# Altium footprint library Funk.PcbLib: 34 footprints (part 1 of 3)
Each footprint in its own frame and in the unit in brackets; x right, y up, seen from the top. Pads: shape width x height; smd on the part's side, far side on the other; paste and mask are expansions set on the pad; w line width, h text height; cw(c..) or ccw(c..) is an arc to the next point about the centre after c.
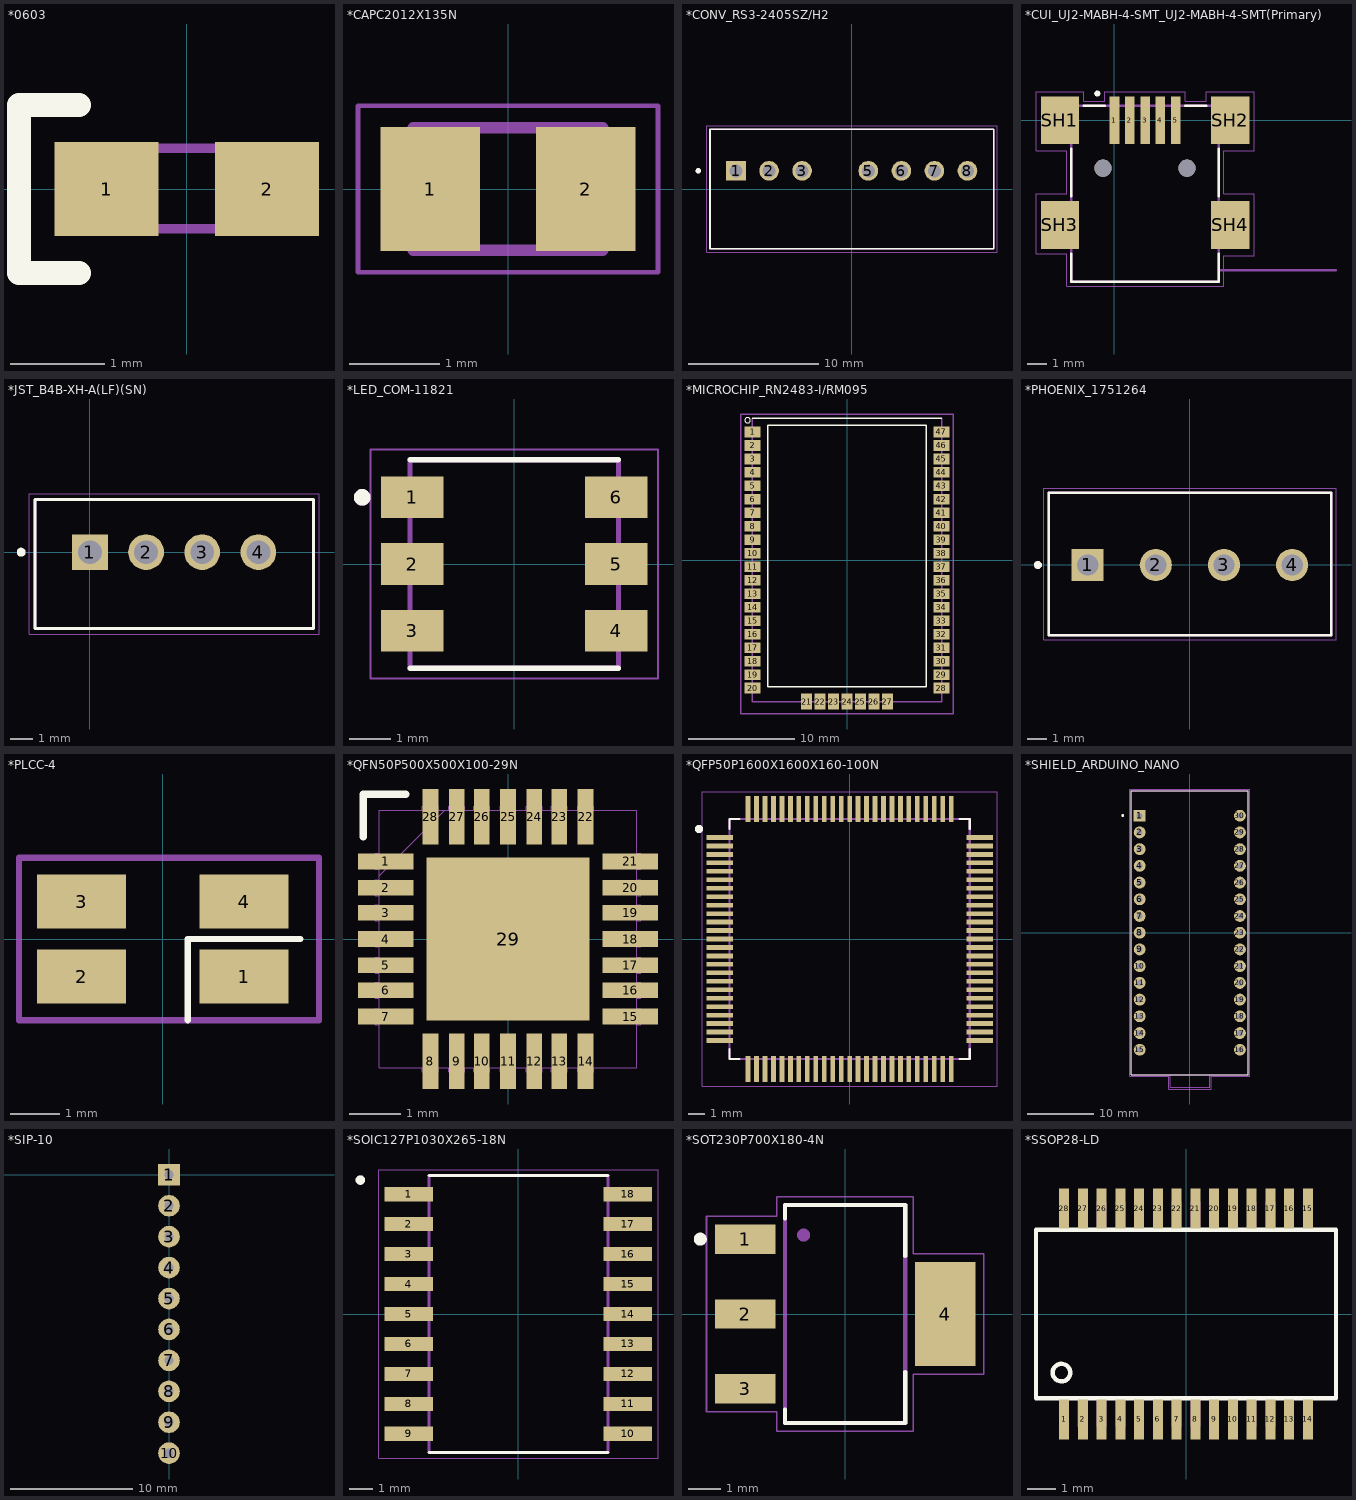
[diagram p0: the footprints below, top view; thin cyan lines are the x and y axes]

## *0603 [mm]
pads (2):
  rect 1.1x1 smd: 1(-0.85,0) 2(0.85,0)
Top Overlay:
  lines w0.254: -1.143,-0.889 -1.778,-0.889 -1.778,-0.762 -1.778,0.889 -1.143,0.889
Mechanical 4:
  region: 0.331,0.48 0.83,0.48 0.83,-0.471 0.331,-0.471
  region: -0.841,0.48 -0.338,0.48 -0.338,-0.472 -0.841,-0.472
  region: 0.331,0.48 0.83,0.48 0.83,-0.471 0.331,-0.471
  region: -0.841,0.48 -0.338,0.48 -0.338,-0.472 -0.841,-0.472
  lines w0.102: -0.356,-0.419 0.356,-0.419 -0.356,-0.419 ; -0.356,0.432 0.356,0.432 -0.356,0.432
3D body "LTST-C190KRKT.STEP": height 0.8, standoff 0, extent -0.8,-0.419 0.8,0.381

## *CAPC2012X135N [mm]
pads (2):
  rect 1.1x1.38 smd: 1(-0.863,0) 2(0.863,0)
Mechanical 4:
  lines w0.127: -1.05,-0.68 -1.05,0.68 ; -1.05,-0.68 1.05,-0.68 ; -1.05,-0.68 -1.05,0.68 ; -1.05,-0.68 1.05,-0.68 ; -1.05,0.68 1.05,0.68 ; -1.05,0.68 1.05,0.68 ; 1.05,-0.68 1.05,0.68 ; 1.05,-0.68 1.05,0.68
Mechanical 16:
  lines w0.05: -1.665,-0.925 -1.665,0.925 1.665,0.925 1.665,-0.925 -1.665,-0.925
3D body "C2012.step": height 1.25, standoff 0, extent -1,-0.625 1,0.625

## *CONV_RS3-2405SZ/H2 [mm]
pads (7):
  rect 1.508x1.508 hole 1: 1(-8.9,1.4)
  round 1.508 hole 1: 2(-6.36,1.4) 3(-3.82,1.4) 5(1.26,1.4) 6(3.8,1.4) 7(6.34,1.4) 8(8.88,1.4)
Top Overlay:
  circle w0.2: c-11.8,1.4 r0.1
  lines w0.127: -10.9,-4.6 10.9,-4.6 10.9,4.6 -10.9,4.6 -10.9,-4.6
Mechanical 4:
  circle w0.2: c-11.8,1.4 r0.1
  circle w0.2: c-11.8,1.4 r0.1
  lines w0.127: -10.9,-4.6 10.9,-4.6 ; -10.9,-4.6 -10.9,4.6 ; -10.9,-4.6 10.9,-4.6 ; -10.9,-4.6 -10.9,4.6 ; -10.9,4.6 10.9,4.6 ; -10.9,4.6 10.9,4.6 ; 10.9,-4.6 10.9,4.6 ; 10.9,-4.6 10.9,4.6
Mechanical 16:
  lines w0.05: -11.15,-4.85 -11.15,4.85 11.15,4.85 11.15,-4.85 -11.15,-4.85
3D body "RS3.step": height 11.1, standoff -4.1, extent -10.9,-4.473 10.9,4.727

## *CUI_UJ2-MABH-4-SMT_UJ2-MABH-4-SMT(Primary) [mm]
pads (11):
  rect 0.5x2.5 smd: 1(0,0) 2(0.8,0) 3(1.6,0) 4(2.4,0) 5(3.2,0)
  round 0.9 hole 0.9 unplated: None(-0.6,-2.51) None(3.8,-2.51)
  rect 2x2.5 smd: SH1(-2.86,0) SH2(6.06,0) SH3(-2.86,-5.48) SH4(6.06,-5.48)
Top Overlay:
  circle w0.16: c-0.9,1.4 r0.08
  lines w0.127: -2.26,-6.98 -2.26,-8.45 5.46,-8.45 5.46,-6.98 ; -2.26,-3.98 -2.26,-1.5 ; -1.61,0.75 -0.5,0.75 ; 3.7,0.75 4.81,0.75 ; 5.46,-3.98 5.46,-1.5
Mechanical 4:
  circle w0.16: c0,0.15 r0.08
  circle w0.16: c0,0.15 r0.08
  lines w0.127: -2.26,-8.45 5.46,-8.45 ; -2.26,-8.45 -2.26,0.75 ; -2.26,-8.45 5.46,-8.45 ; -2.26,-8.45 -2.26,0.75 ; -2.26,0.75 5.46,0.75 ; -2.26,0.75 5.46,0.75 ; 5.46,-8.45 5.46,-7.85 ; 5.46,-8.45 5.46,-7.85 ; 5.46,-7.85 5.46,0.75 ; 5.46,-7.85 11.6,-7.85 5.46,-7.85 ; 5.46,-7.85 5.46,0.75
  text "PCB EDGE" at 5.85,-9.1 h1.88
  text "PCB EDGE" at 5.85,-9.1 h1.88
Mechanical 16:
  lines w0.05: -4.11,-6.98 -4.11,-3.85 -2.51,-3.85 -2.51,-1.6 -4.11,-1.6 -4.11,1.5 -1.61,1.5 -1.61,1 -0.5,1 -0.5,1.5 3.7,1.5 3.7,1 4.81,1 4.81,1.5 7.31,1.5 7.31,-1.6 5.71,-1.6 5.71,-3.85 7.31,-3.85 7.31,-7.1 5.71,-7.1 5.71,-8.7 -2.51,-8.7 -2.51,-6.98 -4.11,-6.98
3D body "CUI_UJ2-MABH-4-SMT.step": height 3.93, standoff -0.95, extent -3.179,-8.418 6.481,0.962

## *JST_B4B-XH-A(LF)(SN) [mm]
pads (4):
  rect 1.59x1.59 hole 1.06: 1(0,0)
  round 1.59 hole 1.06: 2(2.5,0) 3(5,0) 4(7.5,0)
Top Overlay:
  circle w0.2: c-3.06,0 r0.1
  lines w0.127: -2.45,-3.4 -2.45,2.35 9.95,2.35 9.95,-3.4 -2.45,-3.4
Mechanical 4:
  lines w0.127: -2.45,-3.4 -2.45,2.35 ; -2.45,-3.4 9.95,-3.4 ; -2.45,-3.4 -2.45,2.35 ; -2.45,-3.4 9.95,-3.4 ; -2.45,2.35 9.95,2.35 ; -2.45,2.35 9.95,2.35 ; 9.95,-3.4 9.95,2.35 ; 9.95,-3.4 9.95,2.35
Mechanical 16:
  lines w0.05: -2.7,-3.65 -2.7,2.6 10.2,2.6 10.2,-3.65 -2.7,-3.65
3D body "B4B-XH-A.STEP": height 7.06, standoff -3.34, extent -2.517,-3.464 9.883,2.286

## *LED_COM-11821 [mm]
pads (6):
  rect 1.5x1 smd: 1(-2.45,1.6) 2(-2.45,0) 3(-2.45,-1.6) 4(2.45,-1.6) 5(2.45,0) 6(2.45,1.6)
Top Overlay:
  circle w0.2: c-3.65,1.6 r0.1
  lines w0.127: -2.5,-2.5 2.5,-2.5 ; -2.5,2.5 2.5,2.5
Mechanical 4:
  circle w0.2: c-3.65,1.6 r0.1
  circle w0.2: c-3.65,1.6 r0.1
  lines w0.127: -2.5,-2.5 2.5,-2.5 ; -2.5,-2.5 -2.5,2.5 ; -2.5,-2.5 2.5,-2.5 ; -2.5,-2.5 -2.5,2.5 ; -2.5,2.5 2.5,2.5 ; -2.5,2.5 2.5,2.5 ; 2.5,-2.5 2.5,2.5 ; 2.5,-2.5 2.5,2.5
Mechanical 16:
  lines w0.05: -3.45,-2.75 -3.45,2.75 3.45,2.75 3.45,-2.75 -3.45,-2.75
3D body "11821.step": height 1.75, standoff 0, extent -2.7,-2.486 2.7,2.514

## *MICROCHIP_RN2483-I/RM095 [mil]
pads (47):
  rect 60x40 smd: 1(-350,475) 2(-350,425) 3(-350,375) 4(-350,325) 5(-350,275) 6(-350,225) 7(-350,175) 8(-350,125) 9(-350,75) 10(-350,25) 11(-350,-25) 12(-350,-75) 13(-350,-125) 14(-350,-175) 15(-350,-225) 16(-350,-275) 17(-350,-325) 18(-350,-375) 19(-350,-425) 20(-350,-475) 28(350,-475) 29(350,-425) 30(350,-375) 31(350,-325) 32(350,-275) 33(350,-225) 34(350,-175) 35(350,-125) 36(350,-75) 37(350,-25) 38(350,25) 39(350,75) 40(350,125) 41(350,175) 42(350,225) 43(350,275) 44(350,325) 45(350,375) 46(350,425) 47(350,475)
  rect 40x60 smd: 21(-150,-525) 22(-100,-525) 23(-50,-525) 24(0,-525) 25(50,-525) 26(100,-525) 27(150,-525)
Top Overlay:
  circle w0: c-368.5,518.31 r10
  lines w5: -350.39,525.59 350.39,525.59 ; -294.49,-469.69 294.49,-469.69 294.49,499.61 -294.49,499.61 -294.49,-469.69
Mechanical 4:
  lines w5: -350.39,-525.59 350.39,-525.59 ; -350.39,-525.59 -350.39,525.59 -350.39,-525.59 ; -350.39,-525.59 350.39,-525.59 ; 350.39,-525.59 350.39,525.59 350.39,-525.59
Mechanical 16:
  lines w5: -393.7,-570.87 -393.7,541.34 393.7,541.34 393.7,-570.87 -393.7,-570.87
3D body "RN2483.step": height 118.11, standoff -1.02, extent -350.79,-529.99 349.99,520.01

## *PHOENIX_1751264 [mm]
pads (4):
  rect 1.65x1.65 hole 1.1: 1(-5.25,0)
  round 1.65 hole 1.1: 2(-1.75,0) 3(1.75,0) 4(5.25,0)
Top Overlay:
  circle w0.2: c-7.8,0 r0.1
  lines w0.127: -7.25,-3.6 -7.25,3.7 7.25,3.7 7.25,-3.6 -7.25,-3.6
Mechanical 4:
  circle w0.2: c-7.8,0 r0.1
  circle w0.2: c-7.8,0 r0.1
  lines w0.127: -7.25,-3.6 -7.25,3.7 ; -7.25,-3.6 7.25,-3.6 ; -7.25,-3.6 -7.25,3.7 ; -7.25,-3.6 7.25,-3.6 ; -7.25,3.7 7.25,3.7 ; -7.25,3.7 7.25,3.7 ; 7.25,-3.6 7.25,3.7 ; 7.25,-3.6 7.25,3.7
Mechanical 16:
  lines w0.05: -7.5,-3.85 -7.5,3.95 7.5,3.95 7.5,-3.85 -7.5,-3.85
3D body "pxc_1751264_04_MKDS-1-4-3-5_3D.stp": height 8.5, standoff -3.5, extent -7.239,-3.556 7.261,3.744

## *PLCC-4 [mm]
pads (4):
  rect 1.8x1.1 smd: 1(1.651,-0.762) 2(-1.651,-0.762) 3(-1.651,0.762) 4(1.651,0.762)
Top Overlay:
  lines w0.127: 0.508,-1.651 0.508,0 2.794,0
Mechanical 4:
  lines w0.127: 3.175,-1.143 3.175,-0.445 3.175,0.953 3.175,1.651 -2.921,1.651 -2.921,-1.651 3.175,-1.651 3.175,-0.635
3D body "User Library-Osram_Led_PLCC4.step": height 1.95, standoff 0, extent -1.75,-1.4 1.75,1.4

## *QFN50P500X500X100-29N [mil]
pads (29):
  rect 42x12 smd: 1(-93,59) 2(-93,39) 3(-93,20) 4(-93,0) 5(-93,-20) 6(-93,-39) 7(-93,-59) 15(93,-59) 16(93,-39) 17(93,-20) 18(93,0) 19(93,20) 20(93,39) 21(93,59)
  rect 12x42 smd: 8(-59,-93) 9(-39,-93) 10(-20,-93) 11(0,-93) 12(20,-93) 13(39,-93) 14(59,-93) 22(59,93) 23(39,93) 24(20,93) 25(0,93) 26(-20,93) 27(-39,93) 28(-59,93)
  rect 124x124 smd: 29(0,0)
Top Overlay:
  lines w6: -110,78 -110,110 -78,110
Mechanical 4:
  drawing of 234 lines, arcs and shapes, not listed
3D body "QFN28.step": height 35.43, standoff 0, extent -99.21,-99.21 99.22,99.21

## *QFP50P1600X1600X160-100N [mm]
pads (100):
  rect 1.56x0.28 smd: 1(-7.68,6) 2(-7.68,5.5) 3(-7.68,5) 4(-7.68,4.5) 5(-7.68,4) 6(-7.68,3.5) 7(-7.68,3) 8(-7.68,2.5) 9(-7.68,2) 10(-7.68,1.5) 11(-7.68,1) 12(-7.68,0.5) 13(-7.68,0) 14(-7.68,-0.5) 15(-7.68,-1) 16(-7.68,-1.5) 17(-7.68,-2) 18(-7.68,-2.5) 19(-7.68,-3) 20(-7.68,-3.5) 21(-7.68,-4) 22(-7.68,-4.5) 23(-7.68,-5) 24(-7.68,-5.5) 25(-7.68,-6) 51(7.68,-6) 52(7.68,-5.5) 53(7.68,-5) 54(7.68,-4.5) 55(7.68,-4) 56(7.68,-3.5) 57(7.68,-3) 58(7.68,-2.5) 59(7.68,-2) 60(7.68,-1.5) 61(7.68,-1) 62(7.68,-0.5) 63(7.68,0) 64(7.68,0.5) 65(7.68,1) 66(7.68,1.5) 67(7.68,2) 68(7.68,2.5) 69(7.68,3) 70(7.68,3.5) 71(7.68,4) 72(7.68,4.5) 73(7.68,5) 74(7.68,5.5) 75(7.68,6)
  rect 0.28x1.56 smd: 26(-6,-7.68) 27(-5.5,-7.68) 28(-5,-7.68) 29(-4.5,-7.68) 30(-4,-7.68) 31(-3.5,-7.68) 32(-3,-7.68) 33(-2.5,-7.68) 34(-2,-7.68) 35(-1.5,-7.68) 36(-1,-7.68) 37(-0.5,-7.68) 38(0,-7.68) 39(0.5,-7.68) 40(1,-7.68) 41(1.5,-7.68) 42(2,-7.68) 43(2.5,-7.68) 44(3,-7.68) 45(3.5,-7.68) 46(4,-7.68) 47(4.5,-7.68) 48(5,-7.68) 49(5.5,-7.68) 50(6,-7.68) 76(6,7.68) 77(5.5,7.68) 78(5,7.68) 79(4.5,7.68) 80(4,7.68) 81(3.5,7.68) 82(3,7.68) 83(2.5,7.68) 84(2,7.68) 85(1.5,7.68) 86(1,7.68) 87(0.5,7.68) 88(0,7.68) 89(-0.5,7.68) 90(-1,7.68) 91(-1.5,7.68) 92(-2,7.68) 93(-2.5,7.68) 94(-3,7.68) 95(-3.5,7.68) 96(-4,7.68) 97(-4.5,7.68) 98(-5,7.68) 99(-5.5,7.68) 100(-6,7.68)
Top Overlay:
  circle w0.24: c-8.9,6.5 r0.12
  lines w0.127: -7.1,-6.5 -7.1,-7.1 -6.5,-7.1 ; -7.1,6.5 -7.1,7.1 -6.5,7.1 ; 6.5,-7.1 7.1,-7.1 7.1,-6.5 ; 6.5,7.1 7.1,7.1 7.1,6.5
Mechanical 4:
  lines w0.127: -7.1,-7.1 7.1,-7.1 ; -7.1,-7.1 -7.1,7.1 ; -7.1,-7.1 7.1,-7.1 ; -7.1,-7.1 -7.1,7.1 ; -7.1,7.1 7.1,7.1 ; -7.1,7.1 7.1,7.1 ; 7.1,-7.1 7.1,7.1 ; 7.1,-7.1 7.1,7.1
Mechanical 16:
  lines w0.05: -8.71,-8.71 8.71,-8.71 8.71,8.71 -8.71,8.71 -8.71,-8.71
3D body "LQFP-100-11.STEP": height 1.5, standoff 0, extent -8,-8 8,8

## *SHIELD_ARDUINO_NANO [mm]
pads (30):
  rect 1.8x1.8 hole 0.9: 1(-7.62,17.78)
  round 1.8 hole 0.9: 2(-7.62,15.24) 3(-7.62,12.7) 4(-7.62,10.16) 5(-7.62,7.62) 6(-7.62,5.08) 7(-7.62,2.54) 8(-7.62,0) 9(-7.62,-2.54) 10(-7.62,-5.08) 11(-7.62,-7.62) 12(-7.62,-10.16) 13(-7.62,-12.7) 14(-7.62,-15.24) 15(-7.62,-17.78) 16(7.62,-17.78) 17(7.62,-15.24) 18(7.62,-12.7) 19(7.62,-10.16) 20(7.62,-7.62) 21(7.62,-5.08) 22(7.62,-2.54) 23(7.62,0) 24(7.62,2.54) 25(7.62,5.08) 26(7.62,7.62) 27(7.62,10.16) 28(7.62,12.7) 29(7.62,15.24) 30(7.62,17.78)
Top Overlay:
  circle w0.2: c-10.2,17.8 r0.1
  lines w0.127: -8.89,-21.59 8.89,-21.59 8.89,21.59 -8.89,21.59 -8.89,-21.59
Mechanical 4:
  circle w0.2: c-10.2,17.8 r0.1
  circle w0.2: c-10.2,17.8 r0.1
  lines w0.127: -8.89,-21.59 -2.97,-21.59 ; -8.89,-21.59 -8.89,21.59 ; -8.89,-21.59 -2.97,-21.59 ; -8.89,-21.59 -8.89,21.59 ; -8.89,21.59 8.89,21.59 ; -8.89,21.59 8.89,21.59 ; -2.97,-23.495 -2.97,-21.59 ; -2.97,-23.495 3,-23.495 ; -2.97,-23.495 -2.97,-21.59 ; -2.97,-23.495 3,-23.495 ; -2.97,-21.59 3,-21.59 ; -2.97,-21.59 3,-21.59 ; 3,-23.495 3,-21.59 ; 3,-23.495 3,-21.59 ; 3,-21.59 8.89,-21.59 ; 3,-21.59 8.89,-21.59 ; 8.89,-21.59 8.89,21.59 ; 8.89,-21.59 8.89,21.59
Mechanical 16:
  lines w0.05: -9.14,-21.84 -9.14,21.84 9.14,21.84 9.14,-21.84 3.25,-21.84 3.25,-23.745 -3.22,-23.745 -3.22,-21.84 -9.14,-21.84
3D body "arduino_nano.STEP": height 12.7, standoff -5.9, extent -9.127,-23.273 8.873,21.727

## *SIP-10 [mil]
pads (10):
  rect 70x70 hole 30: 1(0,0)
  round 70 hole 30: 2(0,-100) 3(0,-200) 4(0,-300) 5(0,-400) 6(0,-500) 7(0,-600) 8(0,-700) 9(0,-800) 10(0,-900)
3D body "4610x.stp": height 194.69, standoff -135.24, extent -49,-945 48.81,53.04

## *SOIC127P1030X265-18N [mm]
pads (18):
  rect 2.06x0.6 smd: 1(-4.64,5.08) 2(-4.64,3.81) 3(-4.64,2.54) 4(-4.64,1.27) 5(-4.64,0) 6(-4.64,-1.27) 7(-4.64,-2.54) 8(-4.64,-3.81) 9(-4.64,-5.08) 10(4.64,-5.08) 11(4.64,-3.81) 12(4.64,-2.54) 13(4.64,-1.27) 14(4.64,0) 15(4.64,1.27) 16(4.64,2.54) 17(4.64,3.81) 18(4.64,5.08)
Top Overlay:
  circle w0.2: c-6.7,5.68 r0.1
  lines w0.127: -3.8,-5.875 3.8,-5.875 ; -3.8,5.875 3.8,5.875
Mechanical 4:
  circle w0.2: c-6.7,5.68 r0.1
  circle w0.2: c-6.7,5.68 r0.1
  lines w0.127: -3.8,-5.875 3.8,-5.875 ; -3.8,-5.875 -3.8,5.875 ; -3.8,-5.875 3.8,-5.875 ; -3.8,-5.875 -3.8,5.875 ; -3.8,5.875 3.8,5.875 ; -3.8,5.875 3.8,5.875 ; 3.8,-5.875 3.8,5.875 ; 3.8,-5.875 3.8,5.875
Mechanical 16:
  lines w0.05: -5.92,-6.125 5.92,-6.125 5.92,6.125 -5.92,6.125 -5.92,-6.125
3D body "SOIC18-300.step": height 2.65, standoff 0, extent -5.15,-5.765 5.15,5.765

## *SOT230P700X180-4N [mm]
pads (4):
  rect 1.86x0.9 smd: 1(-3.075,2.3) 2(-3.075,0) 3(-3.075,-2.3)
  rect 1.86x3.19 smd: 4(3.075,0)
Top Overlay:
  circle w0.2: c-4.452,2.3 r0.1
  lines w0.127: -1.85,-2.933 -1.85,-3.35 1.85,-3.35 1.85,-1.779 ; -1.85,2.933 -1.85,3.35 1.85,3.35 1.85,1.779
Mechanical 4:
  circle w0.2: c-1.277,2.427 r0.1
  circle w0.2: c-1.277,2.427 r0.1
  lines w0.127: -1.85,-3.35 1.85,-3.35 ; -1.85,-3.35 -1.85,3.35 ; -1.85,-3.35 1.85,-3.35 ; -1.85,-3.35 -1.85,3.35 ; -1.85,3.35 1.85,3.35 ; -1.85,3.35 1.85,3.35 ; 1.85,-3.35 1.85,3.35 ; 1.85,-3.35 1.85,3.35
Mechanical 16:
  lines w0.05: -4.26,-3 -2.1,-3 -2.1,-3.6 2.1,-3.6 2.1,-1.85 4.26,-1.85 4.26,1.85 2.1,1.85 2.1,3.6 -2.1,3.6 -2.1,3 -4.26,3 -4.26,-3
3D body "SOT-223.step": height 1.66, standoff -0.02, extent -3.48,-3.25 3.48,3.25

## *SSOP28-LD [mm]
pads (28):
  rect 0.348x1.397 smd: 1(-4.225,-3.656) 2(-3.575,-3.656) 3(-2.925,-3.656) 4(-2.275,-3.656) 5(-1.625,-3.656) 6(-0.975,-3.656) 7(-0.325,-3.656) 8(0.325,-3.656) 9(0.975,-3.656) 10(1.625,-3.656) 11(2.275,-3.656) 12(2.925,-3.656) 13(3.575,-3.656) 14(4.225,-3.656) 15(4.225,3.656) 16(3.575,3.656) 17(2.925,3.656) 18(2.275,3.656) 19(1.625,3.656) 20(0.975,3.656) 21(0.325,3.656) 22(-0.325,3.656) 23(-0.975,3.656) 24(-1.625,3.656) 25(-2.275,3.656) 26(-2.925,3.656) 27(-3.575,3.656) 28(-4.225,3.656)
Top Overlay:
  circle w0.152: c-4.318,-2.032 r0.305
  lines w0.152: -5.2,-2.925 -5.2,2.925 5.2,2.925 5.2,-2.925 -5.2,-2.925
Mechanical 4:
  drawing of 56 lines, arcs and shapes, not listed
3D body "User Library-SSOP-28-FT232RL.STEP": height 2.16, standoff 0, extent -5.165,-3.878 5.165,3.878